# Altium footprint library THU VIEN PCB.PCBLib: 911 footprints (part 45 of 57)
Each footprint in its own frame and in the unit in brackets; x right, y up, seen from the top. Pads: shape width x height; smd on the part's side, far side on the other; paste and mask are expansions set on the pad; w line width, h text height; cw(c..) or ccw(c..) is an arc to the next point about the centre after c.
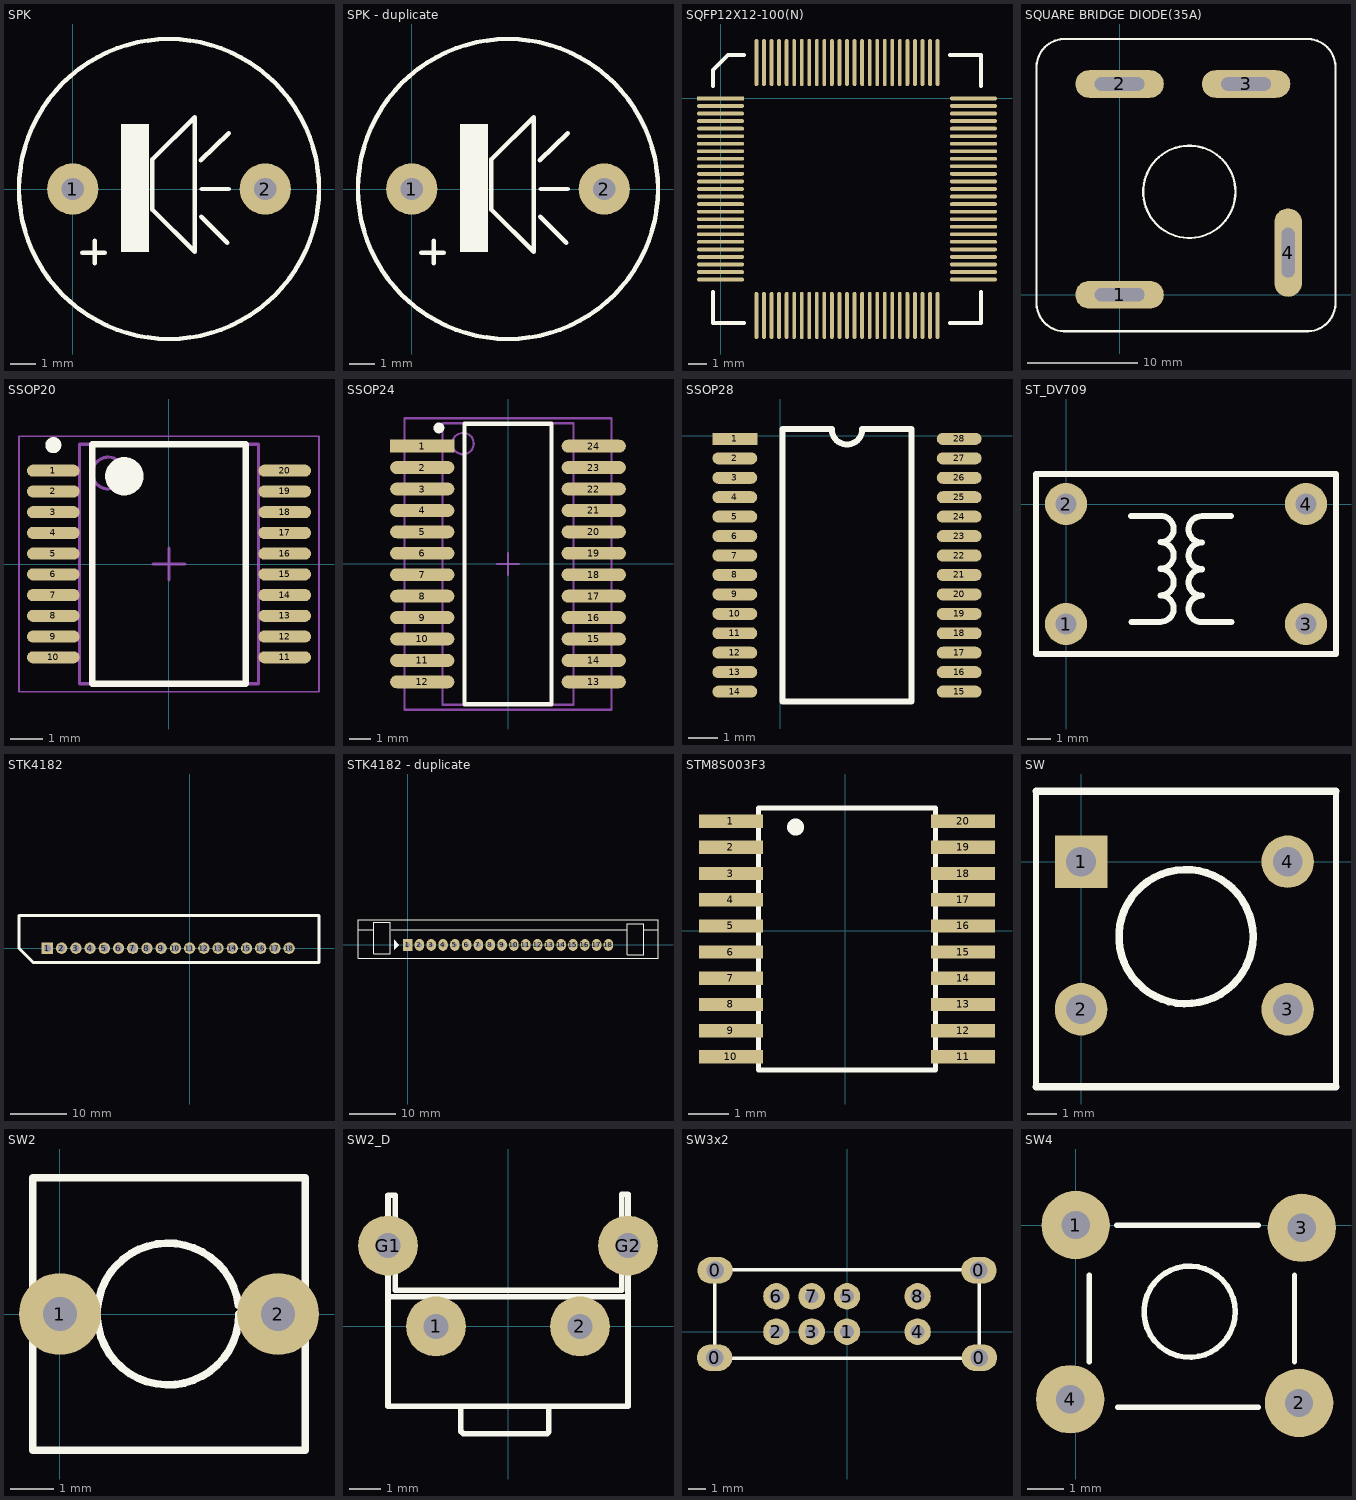
[diagram p44: the footprints below, top view; thin cyan lines are the x and y axes]

## SPK [mil] "Speaker Chip"
height 500
pads (2):
  round 80 hole 35: 1(0,0) 2(300,0)
Top Overlay:
  circle w7: c150,0 r233.73
  rectangle: 75,-98 119,101
  lines w7: 15,-99 50,-99 ; 34,-116 34,-81 ; 199.52,44.52 243,87 ; 200,-43 241,-84 ; 201,0 243,0 ; 124,-32 124,46 190,112 190,-98 124,-32
3D body "Sonitron-SCS-17 P10-DEFAULT.STEP": height 343.51, standoff -267.12, extent -221,-354.14 511.28,378.14

## SPK - duplicate [mil] "Speaker Chip"
height 500
pads (2):
  round 80 hole 35: 1(0,0) 2(300,0)
Top Overlay:
  circle w7: c150,0 r233.73
  rectangle: 75,-98 119,101
  lines w7: 15,-99 50,-99 ; 34,-116 34,-81 ; 199.52,44.52 243,87 ; 200,-43 241,-84 ; 201,0 243,0 ; 124,-32 124,46 190,112 190,-98 124,-32

## SQFP12X12-100(N) [mm]
pads (100):
  rect 2.5x0.2 smd: 1(0,0)
  oval 2.5x0.2 smd: 2(0,-0.4) 3(0,-0.8) 4(0,-1.2) 5(0,-1.6) 6(0,-2) 7(0,-2.4) 8(0,-2.8) 9(0,-3.2) 10(0,-3.6) 11(0,-4) 12(0,-4.4) 13(0,-4.8) 14(0,-5.2) 15(0,-5.6) 16(0,-6) 17(0,-6.4) 18(0,-6.8) 19(0,-7.2) 20(0,-7.6) 21(0,-8) 22(0,-8.4) 23(0,-8.8) 24(0,-9.2) 25(0,-9.6) 51(13.4,-9.6) 52(13.4,-9.2) 53(13.4,-8.8) 54(13.4,-8.4) 55(13.4,-8) 56(13.4,-7.6) 57(13.4,-7.2) 58(13.4,-6.8) 59(13.4,-6.4) 60(13.4,-6) 61(13.4,-5.6) 62(13.4,-5.2) 63(13.4,-4.8) 64(13.4,-4.4) 65(13.4,-4) 66(13.4,-3.6) 67(13.4,-3.2) 68(13.4,-2.8) 69(13.4,-2.4) 70(13.4,-2) 71(13.4,-1.6) 72(13.4,-1.2) 73(13.4,-0.8) 74(13.4,-0.4) 75(13.4,0)
  oval 0.2x2.5 smd: 26(1.9,-11.5) 27(2.3,-11.5) 28(2.7,-11.5) 29(3.1,-11.5) 30(3.5,-11.5) 31(3.9,-11.5) 32(4.3,-11.5) 33(4.7,-11.5) 34(5.1,-11.5) 35(5.5,-11.5) 36(5.9,-11.5) 37(6.3,-11.5) 38(6.7,-11.5) 39(7.1,-11.5) 40(7.5,-11.5) 41(7.9,-11.5) 42(8.3,-11.5) 43(8.7,-11.5) 44(9.1,-11.5) 45(9.5,-11.5) 46(9.9,-11.5) 47(10.3,-11.5) 48(10.7,-11.5) 49(11.1,-11.5) 50(11.5,-11.5) 76(11.5,1.9) 77(11.1,1.9) 78(10.7,1.9) 79(10.3,1.9) 80(9.9,1.9) 81(9.5,1.9) 82(9.1,1.9) 83(8.7,1.9) 84(8.3,1.9) 85(7.9,1.9) 86(7.5,1.9) 87(7.1,1.9) 88(6.7,1.9) 89(6.3,1.9) 90(5.9,1.9) 91(5.5,1.9) 92(5.1,1.9) 93(4.7,1.9) 94(4.3,1.9) 95(3.9,1.9) 96(3.5,1.9) 97(3.1,1.9) 98(2.7,1.9) 99(2.3,1.9) 100(1.9,1.9)
Top Overlay:
  lines w0.2: -0.4,-10.25 -0.4,-11.9 1.25,-11.9 ; -0.4,0.65 -0.4,1.5 0.4,2.3 1.25,2.3 ; 12.15,-11.9 13.8,-11.9 13.8,-10.25 ; 12.15,2.3 13.8,2.3 13.8,0.65

## SQUARE BRIDGE DIODE(35A) [mm]
pads (4):
  oval 8x2.5 hole 1.2 slot 4.5 at 0 deg: 1(0,0) 2(0,19.05) 3(11.43,19.05)
  oval 2.5x8 hole 1.2 slot 4.5 at 90 deg: 4(15.24,3.81)
Top Overlay:
  circle w0.2: c6.303,9.304 r4.17
  lines w0.2: -7.504,-0.6 ccw(c-4.952,-0.75) -4.802,-3.302 16.808,-3.302 ccw(c16.958,-0.75) 19.509,-0.6 19.509,20.41 ccw(c16.958,20.56) 16.808,23.111 -4.802,23.111 ccw(c-4.952,20.56) -7.504,20.41 -7.504,-0.6
3D body "User Library-SquareDiodeBridge-L.step": height 8.05, standoff -11, extent -8.281,-4.217 20.219,24.283

## SSOP20 [mm] "SSOP, 20-Leads, Body 7,35x5,45mm, Pitch 0,65mm, IPC Medium Density"
height 2
pads (20):
  oval 1.65x0.381 smd: 1(-3.625,2.925) 2(-3.625,2.275) 3(-3.625,1.625) 4(-3.625,0.975) 5(-3.625,0.325) 6(-3.625,-0.325) 7(-3.625,-0.975) 8(-3.625,-1.625) 9(-3.625,-2.275) 10(-3.625,-2.925) 11(3.625,-2.925) 12(3.625,-2.275) 13(3.625,-1.625) 14(3.625,-0.975) 15(3.625,-0.325) 16(3.625,0.325) 17(3.625,0.975) 18(3.625,1.625) 19(3.625,2.275) 20(3.625,2.925)
Top Overlay:
  circle w0.6: c-1.4,2.75 r0.3
  circle w0.25: c-3.625,3.725 r0.125
  lines w0.2: -2.4,-3.75 2.4,-3.75 2.4,3.75 -2.4,3.75 -2.4,-3.75
Mechanical 13:
  circle w0.1: c-1.9,2.85 r0.5
  lines w0.1: -2.8,-3.75 2.8,-3.75 2.8,3.75 -2.8,3.75 -2.8,-3.75
Mechanical 15:
  lines w0.05: -4.7,-4 4.7,-4 4.7,4 -4.7,4 -4.7,-4
  lines w0.1: -0.5,0 0.5,0 ; 0,-0.5 0,0.5
3D body: height 2, standoff 0.05, extent -2.8,-3.75 2.8,3.75

## SSOP24 [mm] "SOP, 24-Leads, Body 13.1x6.1mm (max), Pitch 1.00mm, IPC Medium Density"
height 2.1
pads (24):
  rect 3x0.6 smd: 1(-4,5.5)
  oval 3x0.6 smd: 2(-4,4.5) 3(-4,3.5) 4(-4,2.5) 5(-4,1.5) 6(-4,0.5) 7(-4,-0.5) 8(-4,-1.5) 9(-4,-2.5) 10(-4,-3.5) 11(-4,-4.5) 12(-4,-5.5) 13(4,-5.5) 14(4,-4.5) 15(4,-3.5) 16(4,-2.5) 17(4,-1.5) 18(4,-0.5) 19(4,0.5) 20(4,1.5) 21(4,2.5) 22(4,3.5) 23(4,4.5) 24(4,5.5)
Top Overlay:
  circle w0.25: c-3.225,6.35 r0.125
  lines w0.2: -2.032,-6.55 -2.032,6.55 2.032,6.55 2.032,-6.55 -2.032,-6.55
Mechanical 13:
  circle w0.1: c-2.1,5.62 r0.5
  lines w0.1: -3.05,-6.57 -3.05,6.57 3.05,6.57 3.05,-6.57 -3.05,-6.57
Mechanical 15:
  lines w0.1: -0.5,0 0.5,0 ; 0,-0.5 0,0.5 ; -4.825,-6.8 -4.825,6.8 4.825,6.8 4.825,-6.8 -4.825,-6.8
3D body: height 2.1, standoff 0.2, extent -3.05,-6.57 3.05,6.57

## SSOP28 [mm]
pads (28):
  rect 1.5x0.4 smd: 1(-1.524,-0.098)
  oval 1.5x0.4 smd: 2(-1.524,-0.748) 3(-1.524,-1.398) 4(-1.524,-2.048) 5(-1.524,-2.698) 6(-1.524,-3.348) 7(-1.524,-3.998) 8(-1.524,-4.648) 9(-1.524,-5.298) 10(-1.524,-5.948) 11(-1.524,-6.598) 12(-1.524,-7.248) 13(-1.524,-7.898) 14(-1.524,-8.548) 15(5.976,-8.548) 16(5.976,-7.898) 17(5.976,-7.248) 18(5.976,-6.598) 19(5.976,-5.948) 20(5.976,-5.298) 21(5.976,-4.648) 22(5.976,-3.998) 23(5.976,-3.348) 24(5.976,-2.698) 25(5.976,-2.048) 26(5.976,-1.398) 27(5.976,-0.748) 28(5.976,-0.098)
Top Overlay:
  lines w0.2: 0.061,-8.873 4.391,-8.873 4.391,0.227 2.734,0.227 cw(c2.226,0.227) 1.718,0.227 0.061,0.227 0.061,-8.873

## ST_DV709 [mil] "Tranformer for Coxial"
pads (4):
  round 70 hole 35: 1(0,-200) 2(0,0) 3(400,-200) 4(400,0)
Top Overlay:
  lines w10: 108.27,-19.69 157.48,-19.69 cw(c157.48,-41.69) 157.48,-63.7 cw(c157.48,-85.71) 157.48,-107.72 ; 108.82,-196.3 157.48,-196.3 ccw(c157.48,-174.29) 157.48,-152.28 ccw(c157.48,-130.28) 157.48,-108.27 ; 226.38,-108.82 ccw(c226.38,-130.82) 226.38,-152.83 ccw(c226.38,-174.84) 226.38,-196.85 275.59,-196.85 ; 226.38,-108.27 cw(c226.38,-86.26) 226.38,-64.25 cw(c226.38,-42.24) 226.38,-20.23 275.04,-20.23 ; -50,-250 -50,50 450,50 450,-250 -50,-250

## STK4182 [mil]
pads (18):
  rect 80x80 hole 50: 1(-1000,0)
  round 80 hole 50: 2(-900,0) 3(-800,0) 4(-700,0) 5(-600,0) 6(-500,0) 7(-400,0) 8(-300,0) 9(-200,0) 10(-100,0) 11(0,0) 12(100,0) 13(200,0) 14(300,0) 15(400,0) 16(500,0) 17(600,0) 18(700,0)
Top Overlay:
  lines w20: -1200,0 -1200,230 910,230 910,-100 -1100,-100 -1200,0

## STK4182 - duplicate [mil] "Pin to pin 100mil, 18 pin"
pads (18):
  rect 80x100 hole 40: 1(0,0)
  oval 80x100 hole 40: 2(100,0) 3(200,0) 4(300,0) 5(400,0) 6(500,0) 7(600,0) 8(700,0) 9(800,0) 10(900,0) 11(1000,0) 12(1100,0) 13(1200,0) 14(1300,0) 15(1400,0) 16(1500,0) 17(1600,0) 18(1700,0)
Top Overlay:
  region: -115,42.5 -115,-42.5 -75,-2.5 -75,2.5
  lines w10: -420,130 -285,130 ; -140,130 1860,130 ; 2000,130 2120,130 ; -420,-115 -420,215 2120,215 2120,-115 -420,-115 ; -285,-75 -145,-75 -145,190 -285,190 -285,-75 ; 1860,-85 1860,180 2000,180 2000,-85 1860,-85

## STM8S003F3 [mm] "STM8S003F3"
pads (20):
  rect 1.6x0.33 smd: 1(-2.84,2.723) 2(-2.84,2.073) 3(-2.84,1.423) 4(-2.84,0.773) 5(-2.84,0.123) 6(-2.84,-0.527) 7(-2.84,-1.177) 8(-2.84,-1.827) 9(-2.84,-2.477) 10(-2.84,-3.127) 11(2.922,-3.127) 12(2.922,-2.477) 13(2.922,-1.827) 14(2.922,-1.177) 15(2.922,-0.527) 16(2.922,0.123) 17(2.922,0.773) 18(2.922,1.423) 19(2.922,2.073) 20(2.922,2.723)
Top Overlay:
  circle w0.381: c-1.237,2.578 r0.021
  lines w0.127: -2.159,-3.452 2.241,-3.452 2.241,3.048 -2.159,3.048 -2.159,-3.452

## SW [mil]
pads (4):
  rect 70x70 hole 39.37 unplated: 1(0,0)
  round 70 hole 39.37 unplated: 2(0,-196.85) 3(275.59,-196.85) 4(275.59,0)
Top Overlay:
  circle w10: c140,-100 r89.44
  lines w7.87: -60,-300 -60,93.7 ; 340,-300 340,93.7
  lines w10: -60,-300 340,-300 ; -60,93.7 340,93.7

## SW2 [mil] "SW button 2pin, 250x 250 mil"
height 100
pads (2):
  round 75 hole 31: 1(0,0) 2(200,0)
Top Overlay:
  lines w7: 163.64,8.26 ccw(c99.17,0) 164.17,0 ; -25,-125 -25,125 225,125 225,-125 -25,-125

## SW2_D [mil] "SW button 2pin, 300x 300 x 250 mil"
height 100
pads (4):
  round 75 hole 31: 1(-90,0) 2(90,0) G1(-150,101) G2(150,101)
Top Overlay:
  lines w7: -150,37 150,37 ; -59,-100 -59,-131 -56,-134 49,-134 51,-132 51,-100 ; -150,-100 150,-100 150,165 142,165 142,45 -141,45 -141,164 -150,164 -150,-100

## SW3x2 [mil] "Switch 3x2 - pin to pin 80"
height 500
pads (12):
  oval 80x60 hole 40: 0(-300,-59) 0(-299,139) 0(299,139) 0(300,-59)
  round 60 hole 31: 1(0,0) 2(-160,0) 3(-80,0) 4(160,0) 5(0,80) 6(-160,80) 7(-80,80) 8(160,80)
Top Overlay:
  lines w8: -300,-60 300,-60 300,140 -300,140 -300,-60

## SW4 [mil] "SW button 4pin, 250 x250 mil"
height 100
pads (4):
  round 75 hole 31: 1(0,0) 2(245,-195) 3(248,-3) 4(-6,-191)
Top Overlay:
  circle w6: c125,-95 r50
  lines w6: 15,-150 15,-55 ; 45,0 200,0 ; 46,-200 200,-200 ; 240,-150 240,-55
  lines w7: 239,-215 240,-214
3D body "SW3dPS-.STEP": height 275.59, standoff -137.8, extent -35.51,-220 275.51,24.09